# Altium footprint library ParsaLibrary.PcbLib: 526 footprints (part 8 of 33)
Each footprint in its own frame and in the unit in brackets; x right, y up, seen from the top. Pads: shape width x height; smd on the part's side, far side on the other; paste and mask are expansions set on the pad; w line width, h text height; cw(c..) or ccw(c..) is an arc to the next point about the centre after c.
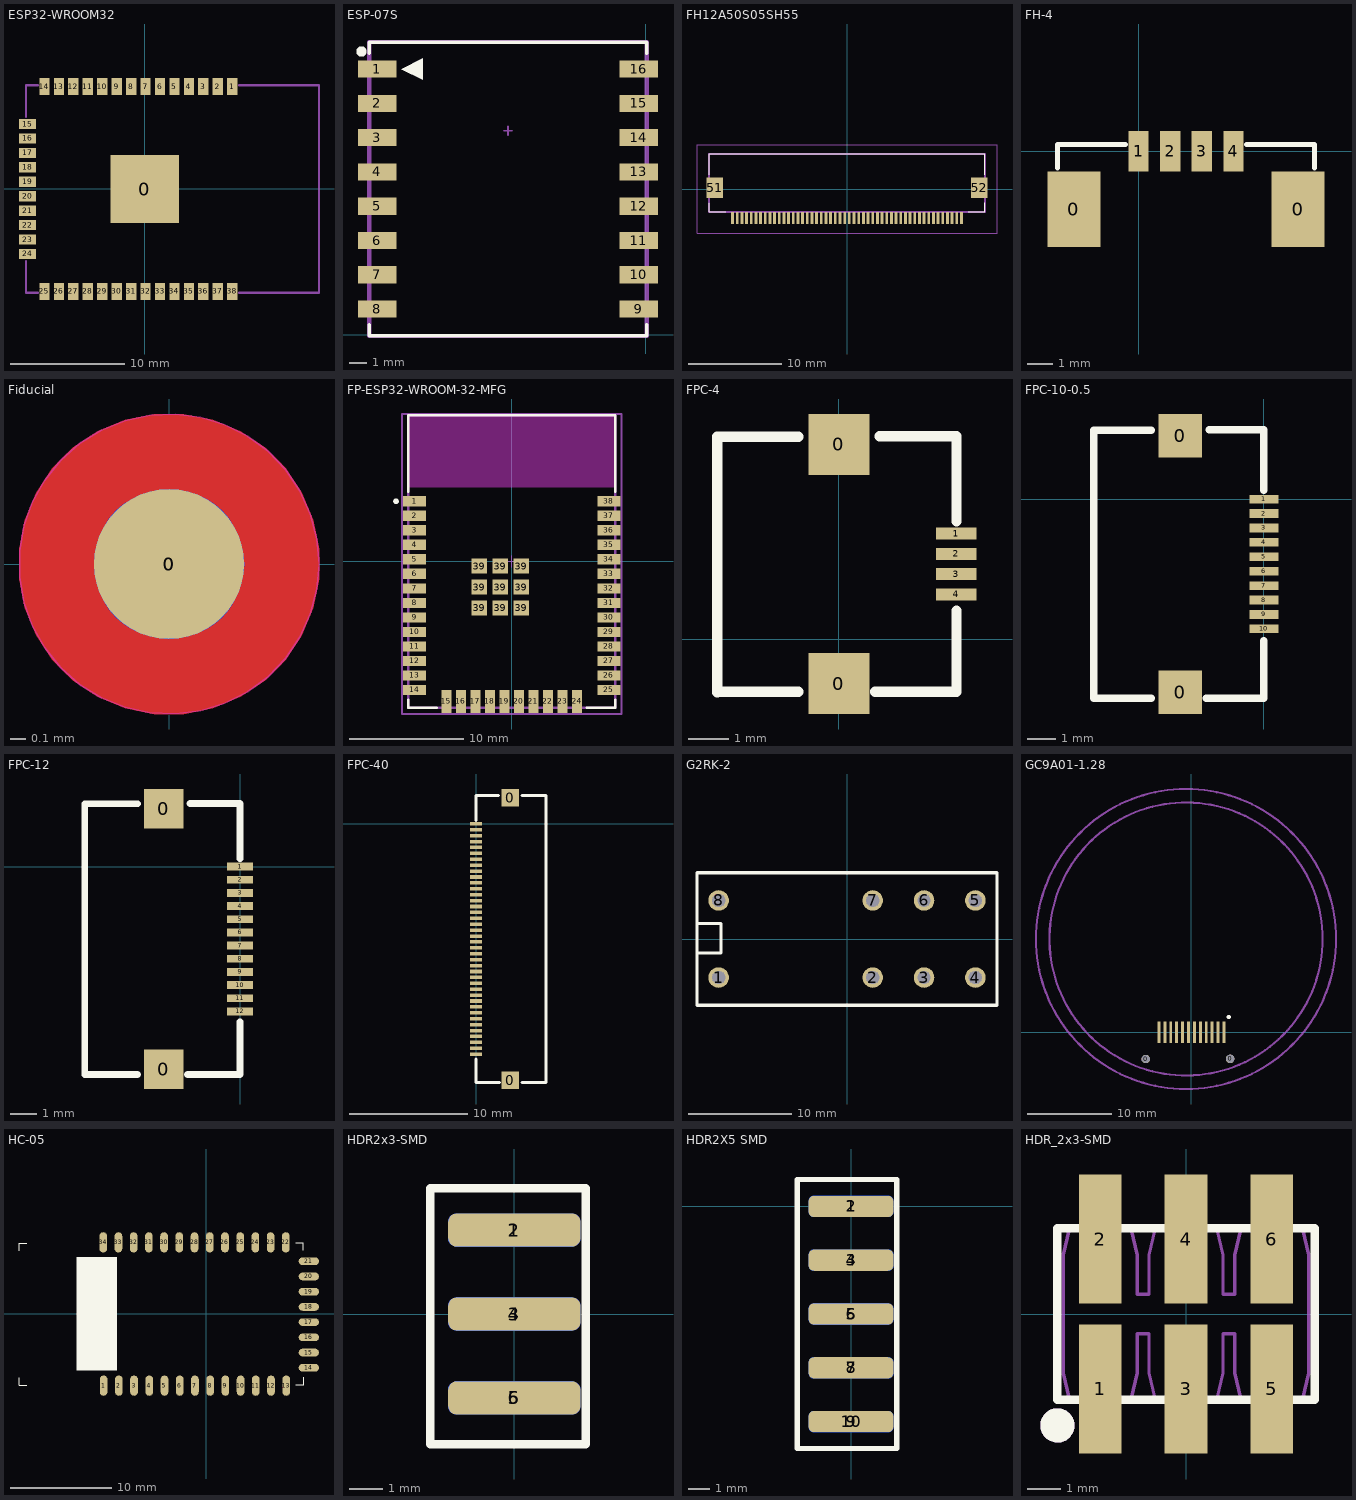
[diagram p7: the footprints below, top view; thin cyan lines are the x and y axes]

## ESP32-WROOM32 [mm]
pads (39):
  rect 6x6 smd: 0(-0.001,-0.004)
  rect 0.9x1.5 smd: 1(7.699,8.996) 2(6.429,8.996) 3(5.159,8.996) 4(3.889,8.996) 5(2.619,8.996) 6(1.349,8.996) 7(0.079,8.996) 8(-1.191,8.996) 9(-2.461,8.996) 10(-3.731,8.996) 11(-5.001,8.996) 12(-6.271,8.996) 13(-7.541,8.996) 14(-8.811,8.996) 25(-8.811,-9.004) 26(-7.541,-9.004) 27(-6.271,-9.004) 28(-5.001,-9.004) 29(-3.731,-9.004) 30(-2.461,-9.004) 31(-1.191,-9.004) 32(0.079,-9.004) 33(1.349,-9.004) 34(2.619,-9.004) 35(3.889,-9.004) 36(5.159,-9.004) 37(6.429,-9.004) 38(7.699,-9.004)
  rect 1.5x0.9 smd: 15(-10.301,5.711) 16(-10.301,4.441) 17(-10.301,3.171) 18(-10.301,1.901) 19(-10.301,0.631) 20(-10.301,-0.639) 21(-10.301,-1.909) 22(-10.301,-3.179) 23(-10.301,-4.449) 24(-10.301,-5.719)
Mechanical 7:
  lines w0.203: -10.428,-6.354 -10.428,-9.131 -9.401,-9.131 ; -10.428,6.346 -10.428,9.123 -9.401,9.123 ; 8.31,-9.131 15.326,-9.131 15.326,9.123 8.31,9.123
3D body "ESP-32 .step": height 2.61, standoff -0.1, extent -10.077,-8.97 15.323,8.93

## ESP-07S [mm]
pads (16):
  rect 2.25x1 smd: 1(-15.655,15.492) 2(-15.655,13.492) 3(-15.655,11.492) 4(-15.655,9.492) 5(-15.655,7.492) 6(-15.655,5.492) 7(-15.655,3.492) 8(-15.655,1.492) 9(-0.405,1.492) 10(-0.405,3.492) 11(-0.405,5.492) 12(-0.405,7.492) 13(-0.405,9.492) 14(-0.405,11.492) 15(-0.405,13.492) 16(-0.405,15.492)
Top Overlay:
  circle w0.3: c-16.58,16.517 r0.15
  region: -14.26,15.492 -12.99,14.857 -12.99,16.127
  lines w0.2: -16.114,0.576 -16.114,-0.076 0.054,-0.076 0.054,0.576 ; -16.114,16.408 -16.114,17.069 0.054,17.069 0.054,16.408
Mechanical 13:
  lines w0.254: -16.114,-0.076 -16.114,17.069 0.054,17.069 0.054,-0.076 -16.114,-0.076
Mechanical 15:
  lines w0.1: -8.284,11.893 -7.776,11.893 ; -8.03,11.639 -8.03,12.147
3D body "esp-07s.x_t": height 3.78, standoff 0.5, extent -16.051,-0.042 -0.051,16.958

## FH12A50S05SH55 [mm]
pads (52):
  rect 0.3x1.3 smd: 1(12.25,-3.1) 2(11.75,-3.1) 3(11.25,-3.1) 4(10.75,-3.1) 5(10.25,-3.1) 6(9.75,-3.1) 7(9.25,-3.1) 8(8.75,-3.1) 9(8.25,-3.1) 10(7.75,-3.1) 11(7.25,-3.1) 12(6.75,-3.1) 13(6.25,-3.1) 14(5.75,-3.1) 15(5.25,-3.1) 16(4.75,-3.1) 17(4.25,-3.1) 18(3.75,-3.1) 19(3.25,-3.1) 20(2.75,-3.1) 21(2.25,-3.1) 22(1.75,-3.1) 23(1.25,-3.1) 24(0.75,-3.1) 25(0.25,-3.1) 26(-0.25,-3.1) 27(-0.75,-3.1) 28(-1.25,-3.1) 29(-1.75,-3.1) 30(-2.25,-3.1) 31(-2.75,-3.1) 32(-3.25,-3.1) 33(-3.75,-3.1) 34(-4.25,-3.1) 35(-4.75,-3.1) 36(-5.25,-3.1) 37(-5.75,-3.1) 38(-6.25,-3.1) 39(-6.75,-3.1) 40(-7.25,-3.1) 41(-7.75,-3.1) 42(-8.25,-3.1) 43(-8.75,-3.1) 44(-9.25,-3.1) 45(-9.75,-3.1) 46(-10.25,-3.1) 47(-10.75,-3.1) 48(-11.25,-3.1) 49(-11.75,-3.1) 50(-12.25,-3.1)
  rect 1.8x2.2 smd: 51(-14.15,0.15) 52(14.15,0.15)
Top Overlay:
  lines w0.1: -14.75,-1.45 -14.75,-2.45 -13,-2.45 ; -14.75,1.55 -14.75,3.75 14.75,3.75 14.75,1.55 ; 13,-2.45 14.75,-2.45 14.75,-1.45
Mechanical 13:
  lines w0.2: -14.75,-2.45 14.75,-2.45 14.75,3.75 -14.75,3.75 -14.75,-2.45
Mechanical 15:
  lines w0.1: -16.05,-4.75 16.05,-4.75 16.05,4.75 -16.05,4.75 -16.05,-4.75
3D body "FH12A-50S-0.5SH_55_.stp": height 2.06, standoff -0.09, extent -14.745,-3.24 14.755,3.76

## FH-4 [mm]
pads (6):
  rect 2.1x3 smd: 0(-2.55,-2.3) 0(6.3,-2.3)
  rect 0.8x1.6 smd: 1(0,0) 2(1.25,0) 3(2.5,0) 4(3.75,0)
Top Overlay:
  lines w0.2: -3.2,-0.66 -3.2,0.254 -0.508,0.254 ; 4.258,0.254 6.95,0.254 6.95,-0.66
3D body "User Library-fh04mr_asm.STEP": height 3.43, standoff 0, extent -3.195,-4.343 6.955,0.257

## Fiducial [mm]
pads (2):
  round 1 smd paste+0 mask+0.5: 0(0,0)
  round 1 smd far side paste+0 mask+0.5: 0(0,0)
Top Layer:
  pour cut-out: 0,-1 -0.098,-1 -0.292,-0.962 -0.474,-0.886 -0.637,-0.777 -0.777,-0.637 -0.886,-0.474 -0.962,-0.292 -1,-0.098 -1,0 -1,0.098 -0.962,0.292 -0.886,0.474 -0.777,0.637 -0.637,0.777 -0.474,0.886 -0.292,0.962 -0.098,1 0,1 0.098,1 0.292,0.962 0.474,0.886 0.637,0.777 0.777,0.637 0.886,0.474 0.962,0.292 1,0.098 1,0 1,-0.098 0.962,-0.292 0.886,-0.474 0.777,-0.637 0.637,-0.777 0.474,-0.886 0.292,-0.962 0.098,-1
Keep-Out Layer:
  circle w0.01: c0,0 r1
  circle w0.01: c0,0 r1

## FP-ESP32-WROOM-32-MFG [mm]
pads (47):
  rect 2x0.9 smd paste+0 mask+0: 1(-8.5,5.26) 2(-8.5,3.99) 3(-8.5,2.72) 4(-8.5,1.45) 5(-8.5,0.18) 6(-8.5,-1.09) 7(-8.5,-2.36) 8(-8.5,-3.63) 9(-8.5,-4.9) 10(-8.5,-6.17) 11(-8.5,-7.44) 12(-8.5,-8.71) 13(-8.5,-9.98) 14(-8.5,-11.25) 25(8.5,-11.25) 26(8.5,-9.98) 27(8.5,-8.71) 28(8.5,-7.44) 29(8.5,-6.17) 30(8.5,-4.9) 31(8.5,-3.63) 32(8.5,-2.36) 33(8.5,-1.09) 34(8.5,0.18) 35(8.5,1.45) 36(8.5,2.72) 37(8.5,3.99) 38(8.5,5.26)
  rect 0.9x2 smd paste+0 mask+0: 15(-5.715,-12.25) 16(-4.445,-12.25) 17(-3.175,-12.25) 18(-1.905,-12.25) 19(-0.635,-12.25) 20(0.635,-12.25) 21(1.905,-12.25) 22(3.175,-12.25) 23(4.445,-12.25) 24(5.715,-12.25)
  rect 1.33x1.33 smd paste+0 mask+0: 39(-2.835,-4.075) 39(-2.835,-2.24) 39(-2.835,-0.405) 39(-1,-4.075) 39(-1,-2.24) 39(-1,-0.405) 39(0.835,-4.075) 39(0.835,-2.24) 39(0.835,-0.405)
Top Overlay:
  circle w0.25: c-10.125,5.26 r0.125
  lines w0.2: -9.05,-12.075 -9.05,-12.8 -6.54,-12.8 ; -9.05,6.085 -9.05,12.8 9.05,12.8 9.05,6.085 ; 6.54,-12.8 9.05,-12.8 9.05,-12.075
Keep-Out Layer:
  rectangle: -9,6.45 9,12.75
  rectangle: -9,6.45 9,12.75
Top 3D Body:
  lines w0.2: -9.05,-12.8 9.05,-12.8 9.05,12.8 -9.05,12.8 -9.05,-12.8
Top Courtyard:
  lines w0.2: -9.6,-13.35 9.6,-13.35 9.6,12.9 -9.6,12.9 -9.6,-13.35
Top Assembly:
  lines w0.2: -9.6,-13.35 9.6,-13.35 9.6,12.9 -9.6,12.9 -9.6,-13.35
  text ".Designator" at 0,-0.037 h1
Top Component Center:
  lines w0.1: -0.5,0 0.5,0 ; 0,-0.5 0,0.5
3D body "UNK_Espressif_Systems_ESP32-WROOM-32_eec.STEP": height 0.25, standoff 0, extent -9.6,-13.35 9.6,12.9

## FPC-4 [mm]
pads (6):
  rect 1.5x1.5 smd: 0(0,-1.1) 0(0,4.8)
  rect 1x0.3 smd: 1(2.9,2.6) 2(2.9,2.1) 3(2.9,1.6) 4(2.9,1.1)
Top Overlay:
  lines w0.254: -3,-1.31 -3,4.99 -2.95,4.99 -1,4.99 ; -3,-1.3 -1,-1.3 ; 0.9,-1.3 2.9,-1.3 2.9,0.7 ; 1,5 2.9,5 2.9,2.9 ; 2.9,2.9 2.9,2.9
3D body "FPC-4.stp": height 2.11, standoff 0, extent -2.95,-1.31 2.9,4.99

## FPC-10-0.5 [mm]
pads (12):
  rect 1.5x1.5 smd: 0(-2.9,-6.7) 0(-2.9,2.2)
  rect 1x0.3 smd: 1(0,0) 2(0,-0.5) 3(0,-1) 4(0,-1.5) 5(0,-2) 6(0,-2.5) 7(0,-3) 8(0,-3.5) 9(0,-4) 10(0,-4.5)
Top Overlay:
  lines w0.254: -3.9,-6.9 -5.9,-6.9 -5.9,2.39 -3.9,2.39 ; -2,-6.9 0,-6.9 0,-4.9 ; -1.9,2.4 0,2.4 0,0.3 ; 0,0.3 0,0.3

## FPC-12 [mm]
pads (14):
  rect 1.5x1.5 smd: 0(-2.9,-7.7) 0(-2.9,2.2)
  rect 1x0.3 smd: 1(0,0) 2(0,-0.5) 3(0,-1) 4(0,-1.5) 5(0,-2) 6(0,-2.5) 7(0,-3) 8(0,-3.5) 9(0,-4) 10(0,-4.5) 11(0,-5) 12(0,-5.5)
Top Overlay:
  lines w0.254: -3.9,-7.9 -5.9,-7.9 -5.9,2.39 -3.9,2.39 ; -2,-7.9 0,-7.9 0,-5.9 ; -1.9,2.4 0,2.4 0,0.3 ; 0,0.3 0,0.3
3D body "FPC-12.stp": height 2.11, standoff 0, extent -5.85,-7.91 0,2.39

## FPC-40 [mm]
pads (42):
  rect 1.5x1.5 smd: 0(2.9,-21.7) 0(2.9,2.2)
  rect 1x0.3 smd: 1(0,0) 2(0,-0.5) 3(0,-1) 4(0,-1.5) 5(0,-2) 6(0,-2.5) 7(0,-3) 8(0,-3.5) 9(0,-4) 10(0,-4.5) 11(0,-5) 12(0,-5.5) 13(0,-6) 14(0,-6.5) 15(0,-7) 16(0,-7.5) 17(0,-8) 18(0,-8.5) 19(0,-9) 20(0,-9.5) 21(0,-10) 22(0,-10.5) 23(0,-11) 24(0,-11.5) 25(0,-12) 26(0,-12.5) 27(0,-13) 28(0,-13.5) 29(0,-14) 30(0,-14.5) 31(0,-15) 32(0,-15.5) 33(0,-16) 34(0,-16.5) 35(0,-17) 36(0,-17.5) 37(0,-18) 38(0,-18.5) 39(0,-19) 40(0,-19.5)
Top Overlay:
  lines w0.254: 0,-19.9 0,-21.9 2,-21.9 ; 1.9,2.4 0,2.4 0,0.3 ; 3.9,-21.9 5.9,-21.9 ; 3.9,2.39 5.9,2.39 5.9,-21.91 ; 0,0.3 0,0.3
3D body "FPC-40.stp": height 2.11, standoff 0, extent -0.05,-21.9 5.8,2.4

## G2RK-2 [mm]
pads (8):
  round 2 hole 1.3: 1(-12.5,-3.75) 2(2.5,-3.75) 3(7.5,-3.75) 4(12.5,-3.75) 5(12.5,3.75) 6(7.5,3.75) 7(2.5,3.75) 8(-12.5,3.75)
Top Overlay:
  lines w0.3: -14.6,-1.346 -12.268,-1.346 -12.268,1.499 -14.6,1.499 ; -14.6,-6.45 14.6,-6.45 14.6,6.45 -14.6,6.45 -14.6,-6.45
3D body "User Library-OMRON G2R-2 RELAY.STEP": height 25.46, standoff -4.51, extent -14.478,-6.275 14.478,6.45

## GC9A01-1.28 [mm]
pads (14):
  round 1 hole 1: 0(-5.403,-3.17) 0(4.597,-3.15)
  rect 0.35x2.54 smd: 1(3.85,0) 2(3.148,0) 3(2.47,0) 4(1.768,0) 5(1.066,0) 6(0.364,0) 7(-0.339,0) 8(-1.041,0) 9(-1.743,0) 10(-2.445,0) 11(-3.148,0) 12(-3.85,0)
Top Overlay:
  circle w0.25: c4.434,1.829 r0.125
Mechanical 1:
  circle w0.254: c-0.635,11.074 r17.8
  circle w0.254: c-0.635,11.074 r16.2
3D body "GC9A01.STEP": height -1.65, standoff -4.42, extent -18.293,-9.322 17.205,29.07

## HC-05 [mm]
pads (34):
  oval 0.76x2 smd: 1(-10.095,-7.06) 2(-8.595,-7.06) 3(-7.095,-7.06) 4(-5.595,-7.06) 5(-4.095,-7.06) 6(-2.595,-7.06) 7(-1.095,-7.06) 8(0.405,-7.06) 9(1.905,-7.06) 10(3.405,-7.06) 11(4.905,-7.06) 12(6.405,-7.06) 13(7.905,-7.06) 22(7.865,7.06) 23(6.365,7.06) 24(4.865,7.06) 25(3.365,7.06) 26(1.865,7.06) 27(0.365,7.06) 28(-1.135,7.06) 29(-2.635,7.06) 30(-4.135,7.06) 31(-5.635,7.06) 32(-7.135,7.06) 33(-8.635,7.06) 34(-10.135,7.06)
  oval 2x0.76 smd: 14(10.135,-5.3) 15(10.135,-3.8) 16(10.135,-2.3) 17(10.135,-0.8) 18(10.135,0.7) 19(10.135,2.2) 20(10.135,3.7) 21(10.135,5.2)
Top Overlay:
  region: -8.767,5.619 -12.767,5.619 -12.767,-5.581 -8.767,-5.581
  lines w0.1: -18.435,-6.28 -18.435,-7.03 -17.685,-7.03 ; -18.425,6.23 -18.425,6.98 -17.675,6.98 ; 8.82,7.025 9.57,7.025 9.57,6.275 ; 8.865,-6.98 9.615,-6.98 9.615,-6.23
3D body "User Library-Bluetooth HC-06_.SLDPRT": height 2.35, standoff 0, extent -18.41,-7.01 9.6,7.01

## HDR2x3-SMD [mm]
pads (6):
  rrect50% 4x1 smd: 1(0,2.54) 3(0,0) 5(0,-2.54)
  rrect50% 4x1 smd far side: 2(0,2.54) 4(0,0) 6(0,-2.54)
Top Overlay:
  lines w0.254: -2.54,-3.937 2.159,-3.937 2.159,3.81 -2.54,3.81 -2.54,-3.937

## HDR2X5 SMD [mm]
pads (10):
  rrect50% 4x1 smd: 1(0,0) 3(0,-2.54) 5(0,-5.08) 7(0,-7.62) 9(0,-10.16)
  rrect50% 4x1 smd far side: 2(0,0) 4(0,-2.54) 6(0,-5.08) 8(0,-7.62) 10(0,-10.16)
Top Overlay:
  lines w0.254: -2.54,-11.43 -2.54,1.27 2.159,1.27 2.159,-11.43 -2.54,-11.43

## HDR_2x3-SMD [mil]
pads (6):
  rect 50x150 smd: 1(-100,-87.5) 2(-100,87.5) 3(0,-87.5) 4(0,87.5) 5(100,-87.5) 6(100,87.5)
Top Overlay:
  circle w20: c-150,-130 r10
  lines w10: -150,-100 150,-100 150,100 -150,100 -150,-100
Mechanical 7:
  circle w20: c-150,-130 r10
  lines w3.94: -113.78,-98.43 -113.78,-119.75 ccw(c-100,-119.75) -86.22,-119.75 -86.22,-98.43 ; -113.78,98.43 -113.78,119.75 cw(c-100,119.75) -86.22,119.75 -86.22,98.43 ; -13.78,-98.43 -13.78,-119.75 ccw(c0,-119.75) 13.78,-119.75 13.78,-98.43 ; -13.78,98.43 -13.78,119.75 cw(c0,119.75) 13.78,119.75 13.78,98.43 ; 86.22,-98.43 86.22,-119.75 ccw(c100,-119.75) 113.78,-119.75 113.78,-98.43 ; 86.22,98.43 86.22,119.75 cw(c100,119.75) 113.78,119.75 113.78,98.43 ; -143.11,-68.71 -136.22,-98.43 -63.78,-98.43 -56.89,-68.71 -56.89,-22.88 -43.11,-22.88 -43.11,-68.71 -36.22,-98.43 36.22,-98.43 43.11,-68.71 43.11,-22.88 56.89,-22.88 56.89,-68.71 63.78,-98.43 136.22,-98.43 143.11,-68.71 143.11,68.71 136.22,98.43 63.78,98.43 56.89,68.71 56.89,22.88 43.11,22.88 43.11,68.71 36.22,98.43 -36.22,98.43 -43.11,68.71 -43.11,22.88 -56.89,22.88 -56.89,68.71 -63.78,98.43 -136.22,98.43 -143.11,68.71 -143.11,-68.71 ; -111.81,-61.81 -88.19,-61.81 -88.19,-38.19 -111.81,-38.19 -111.81,-61.81 ; -111.81,38.19 -88.19,38.19 -88.19,61.81 -111.81,61.81 -111.81,38.19 ; -11.81,-61.81 -11.81,-38.19 11.81,-38.19 11.81,-61.81 -11.81,-61.81 ; -11.81,38.19 -11.81,61.81 11.81,61.81 11.81,38.19 -11.81,38.19 ; 88.19,-61.81 88.19,-38.19 111.81,-38.19 111.81,-61.81 88.19,-61.81 ; 88.19,38.19 88.19,61.81 111.81,61.81 111.81,38.19 88.19,38.19
  text ".Designator" at -66.93,-15.75 h27
3D body "pin_header_a-sl254-dg-g06mp1.stp": height 382.03, standoff -1.57, extent -149.99,-147.63 150.01,147.64